# Altium footprint library FootprintsOld.PcbLib: 93 footprints (part 5 of 6)
Each footprint in its own frame and in the unit in brackets; x right, y up, seen from the top. Pads: shape width x height; smd on the part's side, far side on the other; paste and mask are expansions set on the pad; w line width, h text height; cw(c..) or ccw(c..) is an arc to the next point about the centre after c.
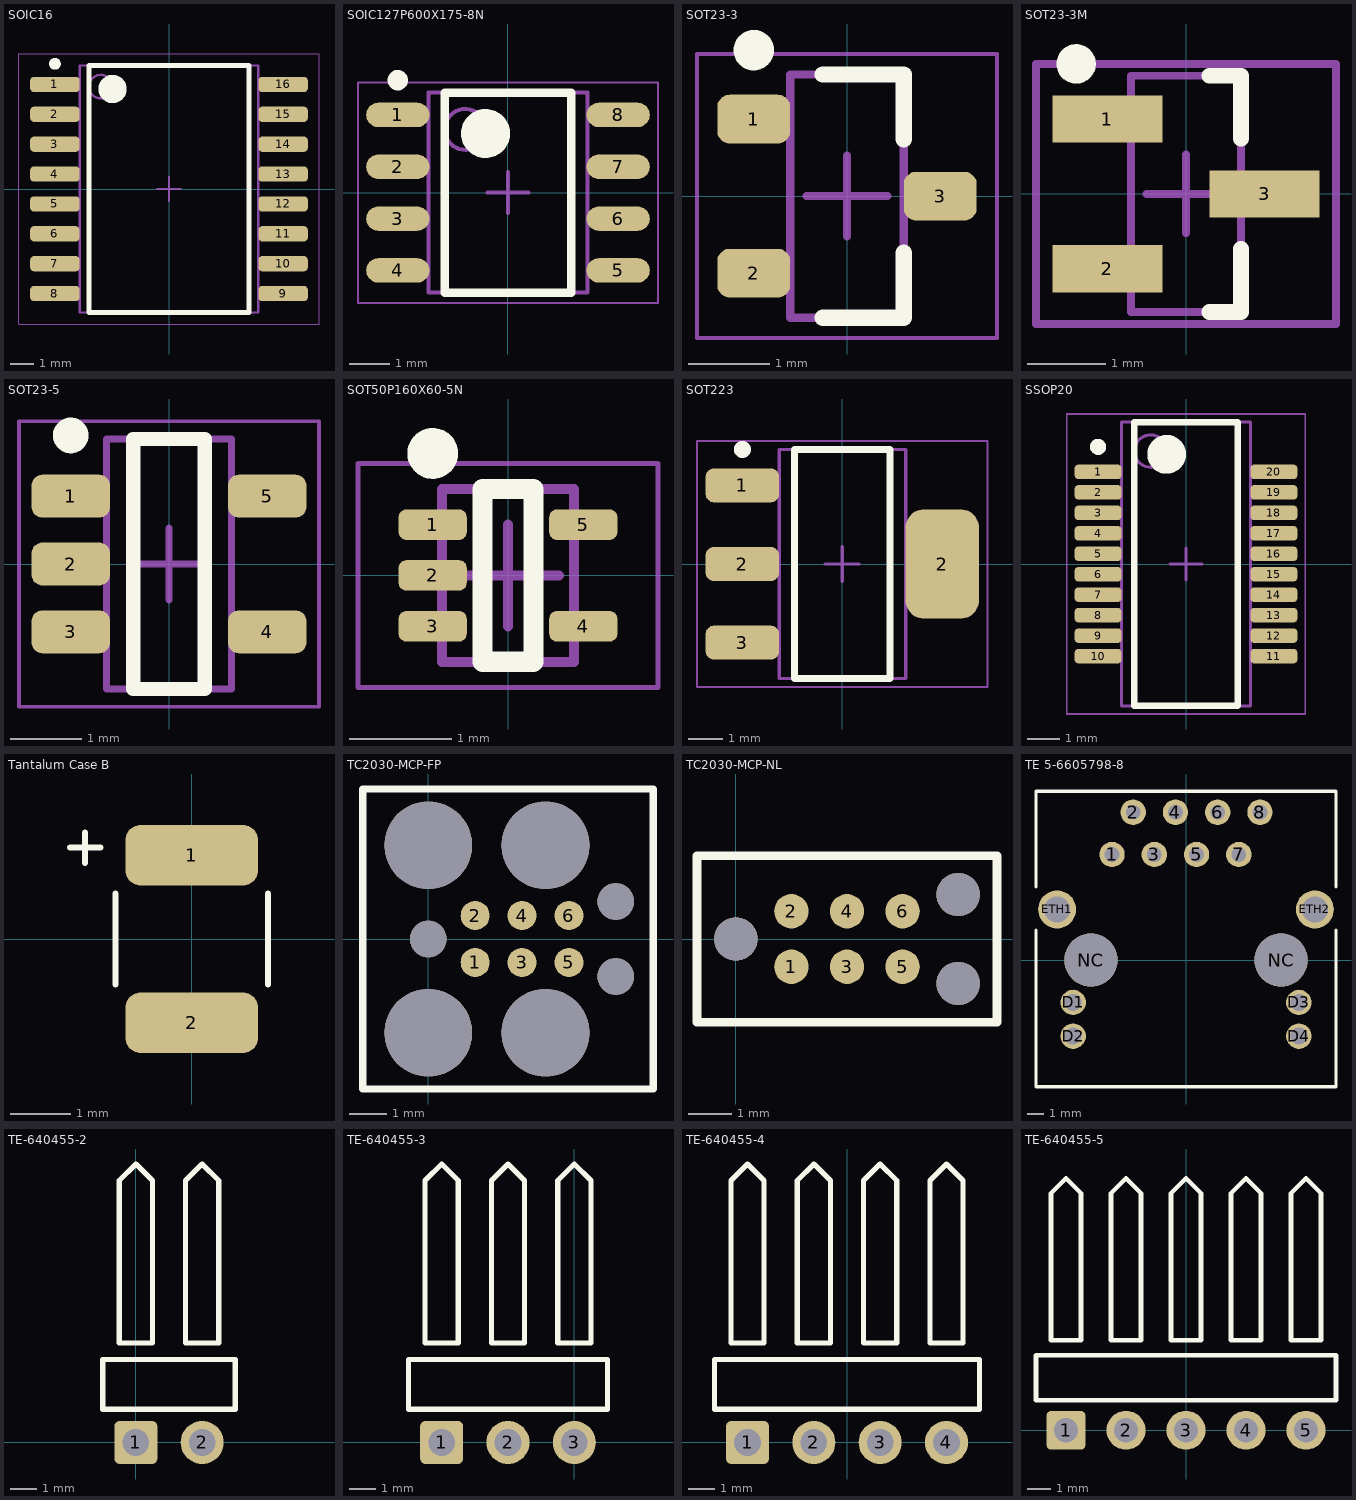
[diagram p4: the footprints below, top view; thin cyan lines are the x and y axes]

## SOIC16 [mm] "SOIC, 16-Leads, Body 10,30x7,50mm, Pitch 1,27mm, IPC Low Density"
height 2.65
pads (16):
  rrect50% 2.1x0.65 smd: 1(-4.85,4.445) 2(-4.85,3.175) 3(-4.85,1.905) 4(-4.85,0.635) 5(-4.85,-0.635) 6(-4.85,-1.905) 7(-4.85,-3.175) 8(-4.85,-4.445) 9(4.85,-4.445) 10(4.85,-3.175) 11(4.85,-1.905) 12(4.85,-0.635) 13(4.85,0.635) 14(4.85,1.905) 15(4.85,3.175) 16(4.85,4.445)
Top Overlay:
  circle w0.6: c-2.4,4.25 r0.3
  circle w0.25: c-4.85,5.32 r0.125
  lines w0.2: -3.4,-5.25 3.4,-5.25 3.4,5.25 -3.4,5.25 -3.4,-5.25
Assembly Top:
  circle w0.1: c-2.9,4.35 r0.5
  lines w0.1: -3.8,-5.25 3.8,-5.25 3.8,5.25 -3.8,5.25 -3.8,-5.25
Courtyard Top:
  lines w0.05: -6.375,-5.75 6.375,-5.75 6.375,5.75 -6.375,5.75 -6.375,-5.75
  lines w0.1: -0.5,0 0.5,0 ; 0,-0.5 0,0.5
3D body: height 2.65, standoff 0.1, extent -3.8,-5.25 3.8,5.25

## SOIC127P600X175-8N [mm] "SOIC, 8-Leads, Body 4,90x3,90mm, Pitch 1,27mm, IPC Medium Density"
height 1.75
pads (8):
  oval 1.55x0.6 smd: 1(-2.7,1.905) 2(-2.7,0.635) 3(-2.7,-0.635) 4(-2.7,-1.905) 5(2.7,-1.905) 6(2.7,-0.635) 7(2.7,0.635) 8(2.7,1.905)
Top Overlay:
  circle w0.6: c-0.55,1.45 r0.3
  circle w0.25: c-2.7,2.755 r0.125
  lines w0.2: -1.55,-2.45 1.55,-2.45 1.55,2.45 -1.55,2.45 -1.55,-2.45
Top Assembly:
  circle w0.1: c-1.05,1.55 r0.5
  lines w0.1: -1.95,-2.45 1.95,-2.45 1.95,2.45 -1.95,2.45 -1.95,-2.45
Courtyard Top (Mech10):
  lines w0.05: -3.675,-2.7 3.675,-2.7 3.675,2.7 -3.675,2.7 -3.675,-2.7
  lines w0.1: -0.5,0 0.5,0 ; 0,-0.5 0,0.5
3D body "SOIC127P600X175-8N.step": height 1.75, standoff 0, extent -3,-2.45 3,2.45

## SOT23-3 [mm] "SOT23, 3-Leads, Body 2.90x2.30mm, Pitch 0.95mm, IPC Medium Density"
height 1.17
pads (3):
  rrect50% 0.9x0.6 smd: 1(-1.15,0.95) 2(-1.15,-0.95) 3(1.15,0)
Top Overlay:
  circle w0.25: c-1.15,1.8 r0.125
  lines w0.2: -0.3,-1.5 0.7,-1.5 0.7,-0.7 ; -0.3,1.5 0.7,1.5 0.7,0.7
Top Assembly:
  lines w0.1: -0.7,-1.5 0.7,-1.5 0.7,1.5 -0.7,1.5 -0.7,-1.5
Courtyard Top (Mech10):
  lines w0.05: -1.85,-1.75 1.85,-1.75 1.85,1.75 -1.85,1.75 -1.85,-1.75
  lines w0.1: -0.5,0 0.5,0 ; 0,-0.5 0,0.5
3D body "SOT23-3.step": height 1.17, standoff 0, extent -1.245,-1.5 1.245,1.5

## SOT23-3M [mm] "SOT23, 3-Leads, Body 2.9x1.3mm, Pitch 0.95mm, Lead Span 2.5mm, IPC Low Density"
height 1.1
pads (3):
  rect 1.397x0.6 smd: 1(-1,0.95) 2(-1,-0.95) 3(1,0)
Top Overlay:
  circle w0.25: c-1.395,1.651 r0.125
  lines w0.2: 0.3,-1.5 0.7,-1.5 0.7,-0.7 ; 0.3,1.5 0.7,1.5 0.7,0.7
Top Assembly (Mech13):
  lines w0.1: -0.7,-1.5 -0.7,1.5 0.7,1.5 0.7,-1.5 -0.7,-1.5
Top Courtyard:
  lines w0.1: -0.5,0 0.5,0 ; 0,-0.5 0,0.5 ; -1.905,-1.651 -1.905,1.651 1.905,1.651 1.905,-1.651 -1.905,-1.651
3D body "SW3DPS-SOT-23-DEFAULT.STEP": height 1.06, standoff -0.04, extent -1.25,-1.5 1.25,1.5

## SOT23-5 [mm] "SOT23, 5-Leads, Body 3.13x2.80mm, Pitch 0.95mm, IPC Medium Density"
height 1.45
pads (5):
  rrect50% 1.1x0.6 smd: 1(-1.375,0.95) 2(-1.375,0) 3(-1.375,-0.95) 4(1.375,-0.95) 5(1.375,0.95)
Top Overlay:
  circle w0.25: c-1.375,1.8 r0.125
  lines w0.2: -0.5,-1.75 0.5,-1.75 0.5,1.75 -0.5,1.75 -0.5,-1.75
Top Assembly:
  lines w0.1: -0.875,-1.75 -0.875,1.75 0.875,1.75 0.875,-1.75 -0.875,-1.75
Courtyard Top (Mech10):
  lines w0.05: -2.1,-2 -2.1,2 2.1,2 2.1,-2 -2.1,-2
  lines w0.1: -0.5,0 0.5,0 ; 0,-0.5 0,0.5
3D body "SOT23-5.step": height 1.45, standoff 0, extent -1.5,-1.75 1.5,1.75

## SOT50P160X60-5N [mm] "SOT23, 5-Leads, Body 1,60x1,60mm, Pitch 0,50mm, IPC Medium Density"
height 0.6
pads (5):
  rrect50% 0.67x0.3 smd mask+0.06: 1(-0.74,0.5) 2(-0.74,0) 3(-0.74,-0.5) 4(0.74,-0.5) 5(0.74,0.5)
Top Overlay:
  circle w0.25: c-0.74,1.2 r0.125
  lines w0.2: -0.25,-0.85 -0.25,0.85 0.25,0.85 0.25,-0.85 -0.25,-0.85
Top Assembly:
  lines w0.1: -0.65,-0.85 0.65,-0.85 0.65,0.85 -0.65,0.85 -0.65,-0.85
Courtyard Top (Mech10):
  lines w0.05: -1.475,-1.1 1.475,-1.1 1.475,1.1 -1.475,1.1 -1.475,-1.1
  lines w0.1: -0.5,0 0.5,0 ; 0,-0.5 0,0.5
3D body "SOT50P160X60-5N.step": height 0.6, standoff 0, extent -0.8,-0.85 0.8,0.85

## SOT223 [mm] "SOT223, 4-Leads, Body 6.50x7.00mm (avg), Pitch 2.30mm, IPC Medium Density"
height 1.8
pads (4):
  rrect50% 2.15x1 smd: 1(-2.925,2.3) 2(-2.925,0) 3(-2.925,-2.3)
  rrect50% 2.15x3.2 smd: 2(2.925,0)
Top Overlay:
  circle w0.25: c-2.925,3.35 r0.125
  lines w0.2: -1.397,-3.35 -1.397,3.35 1.397,3.35 1.397,-3.35 -1.397,-3.35
Top Assembly (Mech13):
  lines w0.1: -1.85,-3.35 -1.85,3.35 1.85,3.35 1.85,-3.35 -1.85,-3.35
Top Courtyard:
  lines w0.05: -4.25,-3.6 -4.25,3.6 4.25,3.6 4.25,-3.6 -4.25,-3.6
  lines w0.1: -0.5,0 0.5,0 ; 0,-0.5 0,0.5
3D body: height 1.8, standoff 0.11, extent -1.85,-3.35 1.85,3.35

## SSOP20 [mm] "SOP, 20-Leads, Body 8.65x3.90mm, Pitch 0.64mm, IPC Medium Density"
height 1.75
pads (20):
  rrect50% 1.45x0.45 smd: 1(-2.725,2.857) 2(-2.725,2.222) 3(-2.725,1.587) 4(-2.725,0.953) 5(-2.725,0.318) 6(-2.725,-0.318) 7(-2.725,-0.953) 8(-2.725,-1.587) 9(-2.725,-2.222) 10(-2.725,-2.857) 11(2.725,-2.857) 12(2.725,-2.222) 13(2.725,-1.587) 14(2.725,-0.953) 15(2.725,-0.318) 16(2.725,0.318) 17(2.725,0.953) 18(2.725,1.587) 19(2.725,2.222) 20(2.725,2.857)
Top Overlay:
  circle w0.25: c-2.725,3.632 r0.125
  circle w0.6: c-0.6,3.4 r0.3
  lines w0.2: -1.6,-4.4 -1.6,4.4 1.6,4.4 1.6,-4.4 -1.6,-4.4
Top Assembly (Mech13):
  circle w0.1: c-1.1,3.5 r0.5
  lines w0.1: -2,-4.4 -2,4.4 2,4.4 2,-4.4 -2,-4.4
Top Courtyard:
  lines w0.05: -3.7,-4.65 -3.7,4.65 3.7,4.65 3.7,-4.65 -3.7,-4.65
  lines w0.1: -0.5,0 0.5,0 ; 0,-0.5 0,0.5
3D body: height 1.75, standoff 0.1, extent -2,-4.4 2,4.4

## Tantalum Case B [mil]
pads (2):
  rrect50% 87x40 smd: 1(0,55) 2(0,-55)
Top Overlay:
  lines w3.94: -80,60 -60,60 ; -70,50 -70,70 ; -50,-30 -50,30 ; 50,-30 50,30
3D body "User Library-CaseB_3528-21.STEP": height 74.8, standoff 0, extent -55.11,-68.9 55.12,68.89

## TC2030-MCP-FP [mil]
pads (13):
  round 31 smd paste-15.5: 1(50,-25) 2(50,25) 3(100,-25) 4(100,25) 5(150,-25) 6(150,25)
  round 93.5 hole 93.5 unplated: ""(0,-100) ""(0,100) ""(125,-100) ""(125,100)
  round 39 hole 39 unplated: ""(0,0) ""(200,-40) ""(200,40)
Top Overlay:
  lines w7.87: -70,-160 240,-160 240,160 -70,160 -70,-160

## TC2030-MCP-NL [mil]
pads (9):
  round 31 smd paste-15.5: 1(50,-25) 2(50,25) 3(100,-25) 4(100,25) 5(150,-25) 6(150,25)
  round 39 hole 39 unplated: ""(0,0) ""(200,-40) ""(200,40)
Top Overlay:
  lines w7.87: -35,-75 235,-75 235,75 -35,75 -35,-75

## TE 5-6605798-8 [mil] "CONN MOD MAG JACK R/A SHIELDED"
pads (16):
  round 60 hole 35: 1(-175,250) 2(-125,350) 3(-75,250) 4(-25,350) 5(25,250) 6(75,350) 7(125,250) 8(175,350)
  round 60 hole 40: D1(-267,-100) D2(-267,-180) D3(267,-100) D4(267,-180)
  round 90 hole 62: ETH1(-305,120) ETH2(305,120)
  round 126 hole 126 unplated: NC(-225,0) NC(225,0)
Top Overlay:
  lines w7.87: -355,71 -355,-300 -54.33,-300 355,-300 355,71 ; -355,173 -355,400 6,400 355,400 355,173
3D body "TE 5-6605798-8.STEP": height 594.81, standoff -145, extent -350,-433.5 349.33,393.5

## TE-640455-2 [mm] "CONN HEADER RTANG 2POS .100 TIN"
pads (2):
  rrect25% 1.65x1.65 hole 1.02: 1(0,0)
  round 1.65 hole 1.02: 2(2.54,0)
Top Overlay:
  lines w0.2: -1.27,1.27 3.81,1.27 3.81,3.175 -1.27,3.175 -1.27,1.27 ; -0.635,3.81 0.635,3.81 0.635,10.033 0,10.668 -0.635,10.033 -0.635,3.81 ; 1.905,3.81 1.905,10.033 2.54,10.668 3.175,10.033 3.175,3.81 1.905,3.81
3D body "c-640455-2-y-3d.STEP": height 6.49, standoff -3.54, extent -1.27,-0.254 3.81,10.795

## TE-640455-3 [mm] "CONN HEADER RTANG 3POS .100 TIN"
pads (3):
  rrect25% 1.65x1.65 hole 1.02: 1(-5.08,0)
  round 1.65 hole 1.02: 2(-2.54,0) 3(0,0)
Top Overlay:
  lines w0.2: -6.35,1.27 1.27,1.27 1.27,3.175 -6.35,3.175 -6.35,1.27 ; -5.715,3.81 -4.445,3.81 -4.445,10.033 -5.08,10.668 -5.715,10.033 -5.715,3.81 ; -3.175,3.81 -3.175,10.033 -2.54,10.668 -1.905,10.033 -1.905,3.81 -3.175,3.81 ; -0.635,3.81 0.635,3.81 0.635,10.033 0,10.668 -0.635,10.033 -0.635,3.81
3D body "c-640455-3-y-3d.STEP": height 6.49, standoff -3.54, extent -6.35,-0.254 1.27,10.795

## TE-640455-4 [mm] "CONN HEADER RTANG 4POS .100 TIN"
pads (4):
  rrect25% 1.65x1.65 hole 1.02: 1(-3.81,0)
  round 1.65 hole 1.02: 2(-1.27,0) 3(1.27,0) 4(3.81,0)
Top Overlay:
  lines w0.2: -5.08,1.27 -5.08,3.175 5.08,3.175 5.08,1.27 -5.08,1.27 ; -4.445,3.81 -4.445,10.033 -3.81,10.668 -3.175,10.033 -3.175,3.81 -4.445,3.81 ; -1.905,3.81 -0.635,3.81 -0.635,10.033 -1.27,10.668 -1.905,10.033 -1.905,3.81 ; 0.635,3.81 0.635,10.033 1.27,10.668 1.905,10.033 1.905,3.81 0.635,3.81 ; 3.175,3.81 3.175,10.033 3.81,10.668 4.445,10.033 4.445,3.81 3.175,3.81
3D body "c-640455-4-y-3d.STEP": height 6.49, standoff -3.54, extent -5.08,-0.254 5.08,10.795

## TE-640455-5 [mm] "CONN HEADER RTANG 5POS .100 TIN"
pads (5):
  rrect25% 1.65x1.65 hole 1.02: 1(-5.08,0)
  round 1.65 hole 1.02: 2(-2.54,0) 3(0,0) 4(2.54,0) 5(5.08,0)
Top Overlay:
  lines w0.2: -6.35,1.27 -6.35,3.175 6.35,3.175 6.35,1.27 -6.35,1.27 ; -5.715,3.81 -5.715,10.033 -5.08,10.668 -4.445,10.033 -4.445,3.81 -5.715,3.81 ; -3.175,3.81 -1.905,3.81 -1.905,10.033 -2.54,10.668 -3.175,10.033 -3.175,3.81 ; -0.635,3.81 -0.635,10.033 0,10.668 0.635,10.033 0.635,3.81 -0.635,3.81 ; 1.905,3.81 1.905,10.033 2.54,10.668 3.175,10.033 3.175,3.81 1.905,3.81 ; 4.445,3.81 4.445,10.033 5.08,10.668 5.715,10.033 5.715,3.81 4.445,3.81
3D body "c-640455-5-y-3d.STEP": height 6.49, standoff -3.54, extent -6.35,-0.33 6.35,10.719